# Altium footprint library 总库.PcbLib: 264 footprints (part 15 of 17)
Each footprint in its own frame and in the unit in brackets; x right, y up, seen from the top. Pads: shape width x height; smd on the part's side, far side on the other; paste and mask are expansions set on the pad; w line width, h text height; cw(c..) or ccw(c..) is an arc to the next point about the centre after c.
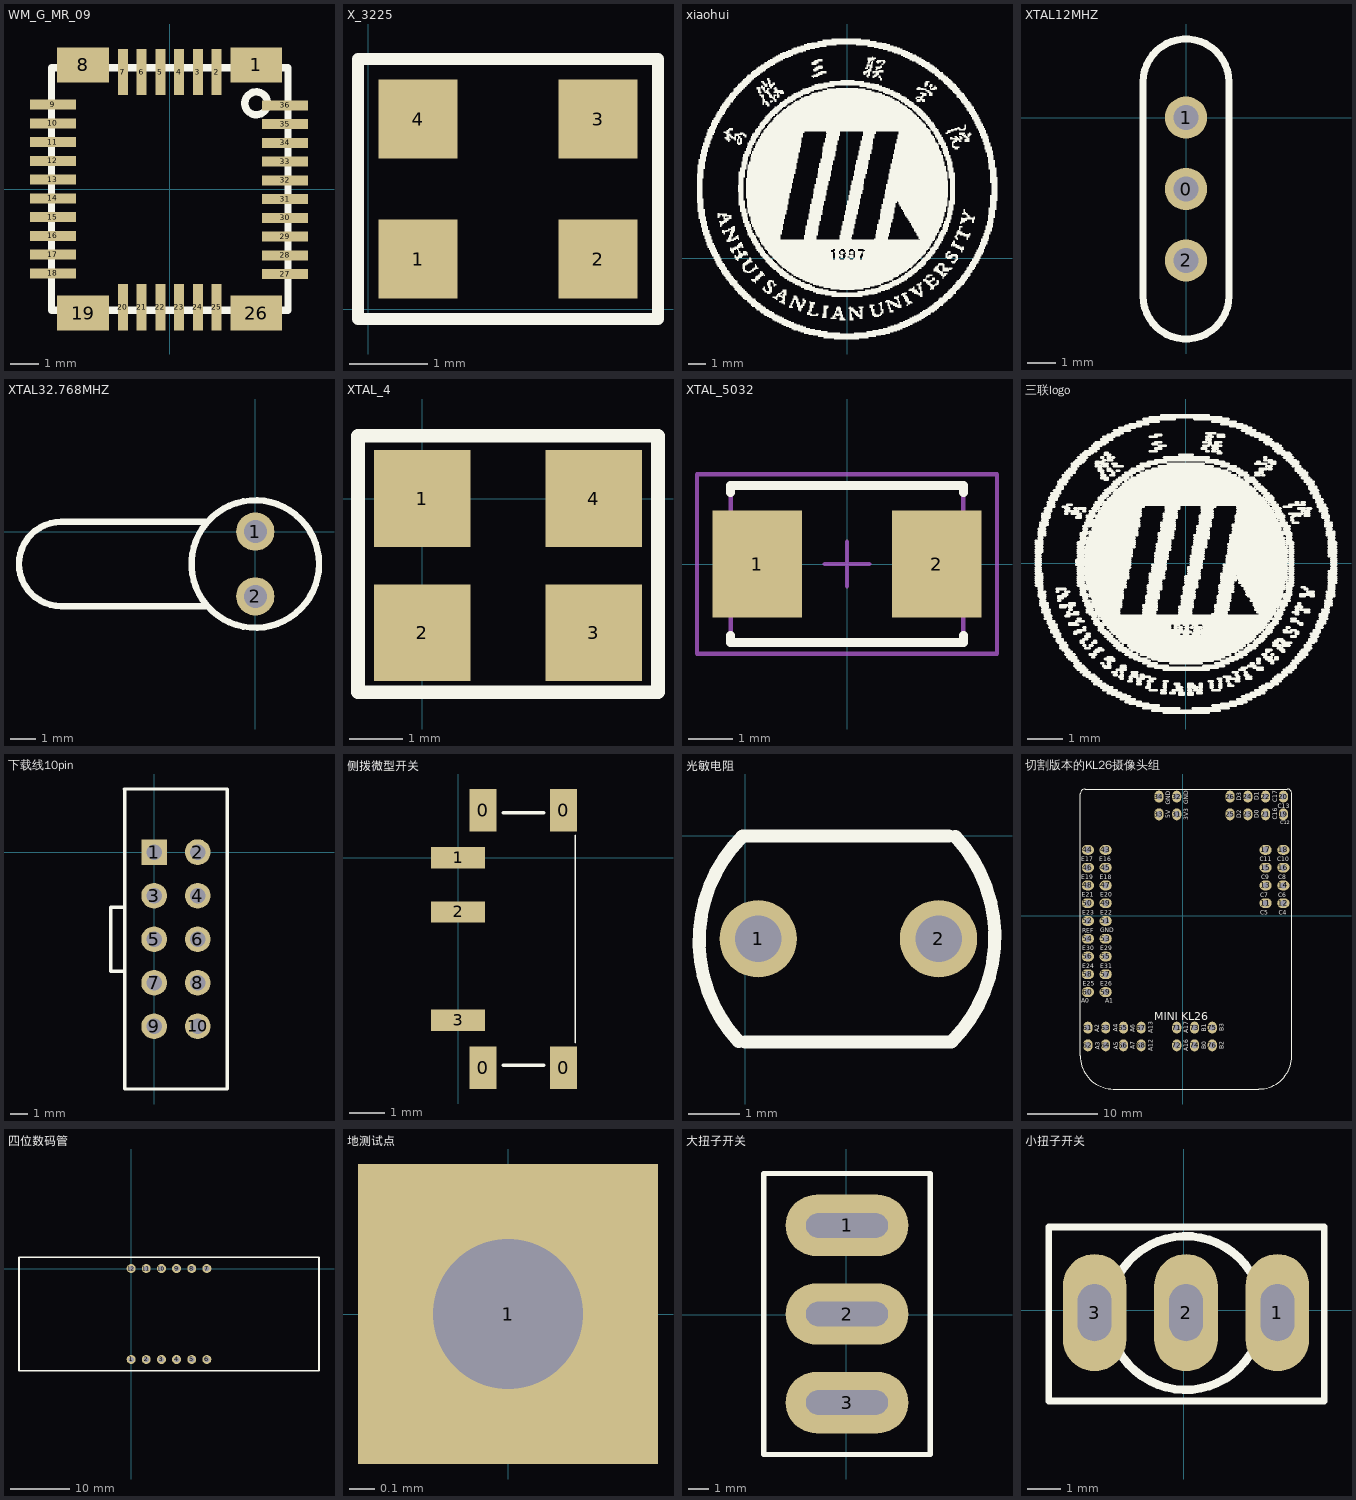
[diagram p14: the footprints below, top view; thin cyan lines are the x and y axes]

## WM_G_MR_09 [mm] "wifi"
pads (36):
  rect 1.8x1.2 smd: 1(3,4.3) 8(-3,4.3) 19(-3,-4.3) 26(3,-4.3)
  rect 0.35x1.6 smd: 2(1.625,4.05) 3(0.975,4.05) 4(0.325,4.05) 5(-0.325,4.05) 6(-0.975,4.05) 7(-1.625,4.05) 20(-1.625,-4.1) 21(-0.975,-4.1) 22(-0.325,-4.1) 23(0.325,-4.1) 24(0.975,-4.1) 25(1.625,-4.1)
  rect 1.6x0.35 smd: 9(-4.05,2.925) 10(-4.05,2.275) 11(-4.05,1.625) 12(-4.05,0.975) 13(-4.05,0.325) 14(-4.05,-0.325) 15(-4.05,-0.975) 16(-4.05,-1.625) 17(-4.05,-2.275) 18(-4.05,-2.925) 27(4,-2.95) 28(4,-2.3) 29(4,-1.65) 30(4,-1) 31(4,-0.35) 32(4,0.3) 33(4,0.95) 34(4,1.6) 35(4,2.25) 36(4,2.9)
Top Overlay:
  circle w0.254: c3,2.97 r0.397
  lines w0.254: -4.1,-4.2 4.1,-4.2 4.1,4.2 -4.1,4.2 -4.1,-4.2

## X_3225 [mm]
height 1.75
pads (4):
  rect 1x1 smd: 1(0.635,0.635) 2(2.921,0.635) 3(2.921,2.413) 4(0.635,2.413)
Top Overlay:
  lines w0.152: -0.127,-0.127 -0.127,3.175 3.683,3.175 3.683,-0.127 -0.127,-0.127
3D body: height 0.76, standoff 0, extent 0.132,0.141 3.425,2.917

## xiaohui [mm]
Top Overlay:
  drawing of 2130 lines, arcs and shapes, not listed

## XTAL12MHZ [mm]
pads (3):
  round 1.5 hole 0.9: 0(0,-2.54) 1(0,0) 2(0,-5.08)
Top Overlay:
  lines w0.254: -1.524,-6.35 ccw(c0,-6.35) 1.524,-6.35 1.524,1.27 ccw(c0,1.27) -1.524,1.27 -1.524,-6.35
3D body: height 3.09, standoff -2.54, extent -1.524,-7.874 1.524,2.794

## XTAL32.768MHZ [mm]
pads (2):
  round 1.5 hole 0.9: 1(0,0) 2(0,-2.54)
Top Overlay:
  circle w0.254: c0,-1.27 r2.5
  lines w0.254: -1.905,-2.921 -7.62,-2.921 cw(c-7.62,-1.27) -7.62,0.381 -1.905,0.381
3D body: height 1.05, standoff -1.05, extent -9.029,-2.667 2.171,0.133

## XTAL_4 [mm]
pads (4):
  rect 1.8x1.8 smd: 1(0,0) 2(0,-2.5) 3(3.2,-2.5) 4(3.2,0)
Top Overlay:
  lines w0.254: -1.194,-3.607 4.394,-3.607 4.394,1.168 -1.194,1.168 -1.194,-3.607

## XTAL_5032 [mm] "Molded Capacitor, 2-Leads, Body 5.0x3.2mm, IPC Medium Density"
height 1.5
pads (2):
  rect 2x2.4 smd: 1(-2,0) 2(2,0)
Top Overlay:
  lines w0.2: -2.6,-1.6 -2.6,-1.75 2.6,-1.75 2.6,-1.6 ; -2.6,1.6 -2.6,1.75 2.6,1.75 2.6,1.6
Mechanical 13:
  lines w0.1: -2.6,-1.7 -2.6,1.7 2.6,1.7 2.6,-1.7 -2.6,-1.7
Mechanical 15:
  lines w0.1: -0.5,0 0.5,0 ; 0,-0.5 0,0.5 ; -3.35,-2 -3.35,2 3.35,2 3.35,-2 -3.35,-2
3D body: height 1, standoff 0, extent -2.5,-1.6 2.5,1.6

## 三联logo [mm]
Top Overlay:
  drawing of 1015 lines, arcs and shapes, not listed

## 下载线10pin [mm]
pads (10):
  rect 1.5x1.5 hole 0.9: 1(0,0)
  round 1.5 hole 0.9: 2(2.54,0) 3(0,-2.54) 4(2.54,-2.54) 5(0,-5.08) 6(2.54,-5.08) 7(0,-7.62) 8(2.54,-7.62) 9(0,-10.16) 10(2.54,-10.16)
Top Overlay:
  lines w0.203: -2.54,-3.226 -1.727,-3.226 ; -2.533,-3.26 -2.533,-6.96 -1.727,-6.96 ; -1.733,3.683 4.267,3.683 4.267,-13.817 ; -1.727,3.683 -1.727,-13.817 4.273,-13.817
3D body: height 8.51, standoff -2.99, extent -1.245,-11.455 3.835,1.245
3D body: height 13.02, standoff 2.72, extent -2.612,-13.818 4.288,3.482

## 侧拨微型开关 [mm]
pads (7):
  rect 0.762x1.2 smd: 0(0.705,-5.913) 0(0.705,1.341) 0(2.978,-5.913) 0(2.978,1.341)
  rect 1.524x0.6 smd: 1(0,0) 2(0,-1.524) 3(0,-4.572)
Top Overlay:
  lines w0.051: 3.302,-5.207 3.302,0.635
  lines w0.1: 1.27,-5.842 2.413,-5.842 ; 1.27,1.27 2.413,1.27

## 光敏电阻 [mm]
pads (2):
  round 1.5 hole 0.9: 1(0.25,-2) 2(3.75,-2)
Top Overlay:
  lines w0.254: -0.127,-3.994 cw(c1.979,-2.038) -0.053,-0.006 3.947,-0.006 ; 0,-4 4,-4 ccw(c1.968,-1.968) 4.074,-0.012

## 切割版本的KL26摄像头组 [mm]
pads (52):
  oval 1.75x1.397 hole 0.9: 11(11.811,1.778) 12(14.351,1.778) 13(11.811,4.318) 14(14.351,4.318) 15(11.811,6.858) 16(14.351,6.858) 17(11.811,9.398) 18(14.351,9.398) 43(-11.049,9.398) 44(-13.589,9.398) 45(-11.049,6.858) 46(-13.589,6.858) 47(-11.049,4.318) 48(-13.589,4.318) 49(-11.049,1.778) 50(-13.589,1.778) 51(-11.049,-0.762) 52(-13.589,-0.762) 53(-11.049,-3.302) 54(-13.589,-3.302) 55(-11.049,-5.842) 56(-13.589,-5.842) 57(-11.049,-8.382) 58(-13.589,-8.382) 59(-11.049,-10.922) 60(-13.589,-10.922)
  oval 1.3x1.7 hole 0.9: 19(14.351,14.478) 20(14.351,17.018) 21(11.811,14.478) 22(11.811,17.018) 23(9.271,14.478) 24(9.271,17.018) 25(6.731,14.478) 26(6.731,17.018) 31(-0.889,14.478) 32(-0.889,17.018) 33(-3.429,14.478) 34(-3.429,17.018) 61(-13.589,-16.002) 62(-13.589,-18.542) 63(-11.049,-16.002) 64(-11.049,-18.542) 65(-8.509,-16.002) 66(-8.509,-18.542) 67(-5.969,-16.002) 68(-5.969,-18.542) 71(-0.889,-16.002) 72(-0.889,-18.542) 73(1.651,-16.002) 74(1.651,-18.542) 75(4.191,-16.002) 76(4.191,-18.542)
Top Overlay:
  lines w0.1: -14.674,-20.05 ccw(c-9.942,-20.05) -9.942,-24.783 10.863,-24.783 ccw(c10.863,-20.101) 15.545,-20.101 15.545,17.497 ccw(c14.941,17.497) 14.941,18.1 -13.996,18.1 ccw(c-13.996,17.422) -14.674,17.422 -14.674,-20.05
  text "C5" at 11.039,0.097 h0.64
  text "C4" at 13.696,0.097 h0.64
  text "C6" at 13.61,2.645 h0.64
  text "C7" at 11.047,2.651 h0.64
  text "C9" at 11.157,5.207 h0.64
  text "C8" at 13.653,5.219 h0.64
  text "C10" at 13.487,7.751 h0.64
  text "C11" at 10.953,7.74 h0.64
  text "GND" at -1.796,15.875 h0.64
  text "5V" at -1.798,13.9 h0.64
  text "3V3" at 0.774,13.667 h0.64
  text "GND" at 0.736,15.894 h0.64
  text "D3" at 8.353,16.43 h0.64
  text "D2" at 8.353,13.89 h0.64
  text "D0" at 10.846,13.908 h0.64
  text "D1" at 10.847,16.468 h0.64
  text "C17" at 13.48,16.179 h0.64
  text "C16" at 13.461,13.677 h0.64
  text "C13" at 13.547,15.379 h0.64
  text "C12" at 13.942,13.072 h0.5
  text "MINI KL26" at -4.082,-14.946 h1.15
  text "E25" at -14.349,-10.051 h0.64
  text "E26" at -11.817,-10.023 h0.64
  text "E31" at -11.848,-7.535 h0.64
  text "E24" at -14.425,-7.558 h0.64
  text "E30" at -14.4,-4.963 h0.64
  text "E29" at -11.834,-4.952 h0.64
  text "GND" at -11.834,-2.384 h0.64
  text "REF" at -14.365,-2.452 h0.64
  text "E23" at -14.411,0.137 h0.64
  text "E22" at -11.834,0.137 h0.64
  text "E20" at -11.834,2.68 h0.64
  text "E21" at -14.468,2.714 h0.64
  text "E19" at -14.513,5.223 h0.64
  text "E18" at -11.891,5.212 h0.64
  text "E16" at -11.947,7.757 h0.64
  text "E17" at -14.513,7.757 h0.64
  text "A0" at -14.522,-12.474 h0.64
  text "A1" at -11.109,-12.419 h0.64
  text "A2" at -11.936,-16.636 h0.64
  text "A3" at -11.917,-19.157 h0.64
  text "A4" at -9.312,-16.612 h0.64
  text "A5" at -9.281,-19.176 h0.64
  text "A6" at -6.908,-16.648 h0.64
  text "A7" at -6.858,-19.135 h0.64
  text "A13" at -4.306,-16.845 h0.64
  text "A12" at -4.306,-19.42 h0.64
  text "A17" at 0.774,-16.845 h0.64
  text "A16" at 0.774,-19.385 h0.64
  text "B1" at 3.303,-16.575 h0.64
  text "B0" at 3.337,-19.068 h0.64
  text "B3" at 5.836,-16.544 h0.64
  text "B2" at 5.819,-19.102 h0.64

## 四位数码管 [mm]
pads (12):
  round 1.5 hole 0.9: 1(0,-15.24) 2(2.54,-15.24) 3(5.08,-15.24) 4(7.62,-15.24) 5(10.16,-15.24) 6(12.7,-15.24) 7(12.7,0) 8(10.16,0) 9(7.62,0) 10(5.08,0) 11(2.54,0) 12(0,0)
Top Overlay:
  lines w0.254: -18.8,-17.121 -18.8,1.879 31.5,1.879 31.5,-17.121 -18.8,-17.121

## 地测试点 [mm]
pads (1):
  rect 1.2x1.2 hole 0.6: 1(0,0)

## 大扭子开关 [mm]
pads (3):
  oval 6x3 hole 1.2 slot 4 at 0 deg: 1(0.025,4.343) 2(0.025,0.025) 3(0.025,-4.293)
Top Overlay:
  lines w0.254: -4.039,-6.833 -4.039,6.883 4.089,6.883 4.089,-6.833 -4.039,-6.833

## 小扭子开关 [mm]
pads (3):
  oval 1.9x3.5 hole 1 slot 1.7 at 90 deg: 1(2.794,-0.064) 2(0.064,-0.064) 3(-2.667,-0.064)
Top Overlay:
  circle w0.254: c0.051,-0.076 r2.295
  circle w0.254: c0.051,-0.051 r0.808
  lines w0.203: -4.039,-2.705 -4.039,2.495 ; -4.009,-2.705 4.191,-2.705 4.191,2.495 -4.009,2.495
3D body: height 24, standoff 14, extent -0.764,-0.866 0.866,0.764
3D body: height 14, standoff 8, extent -2.254,-2.381 2.356,2.229
3D body: height 8, standoff 0, extent -4.14,-2.807 4.293,2.596